# Altium footprint library Connectors.PcbLib: 69 footprints (part 1 of 5)
Each footprint in its own frame and in the unit in brackets; x right, y up, seen from the top. Pads: shape width x height; smd on the part's side, far side on the other; paste and mask are expansions set on the pad; w line width, h text height; cw(c..) or ccw(c..) is an arc to the next point about the centre after c.
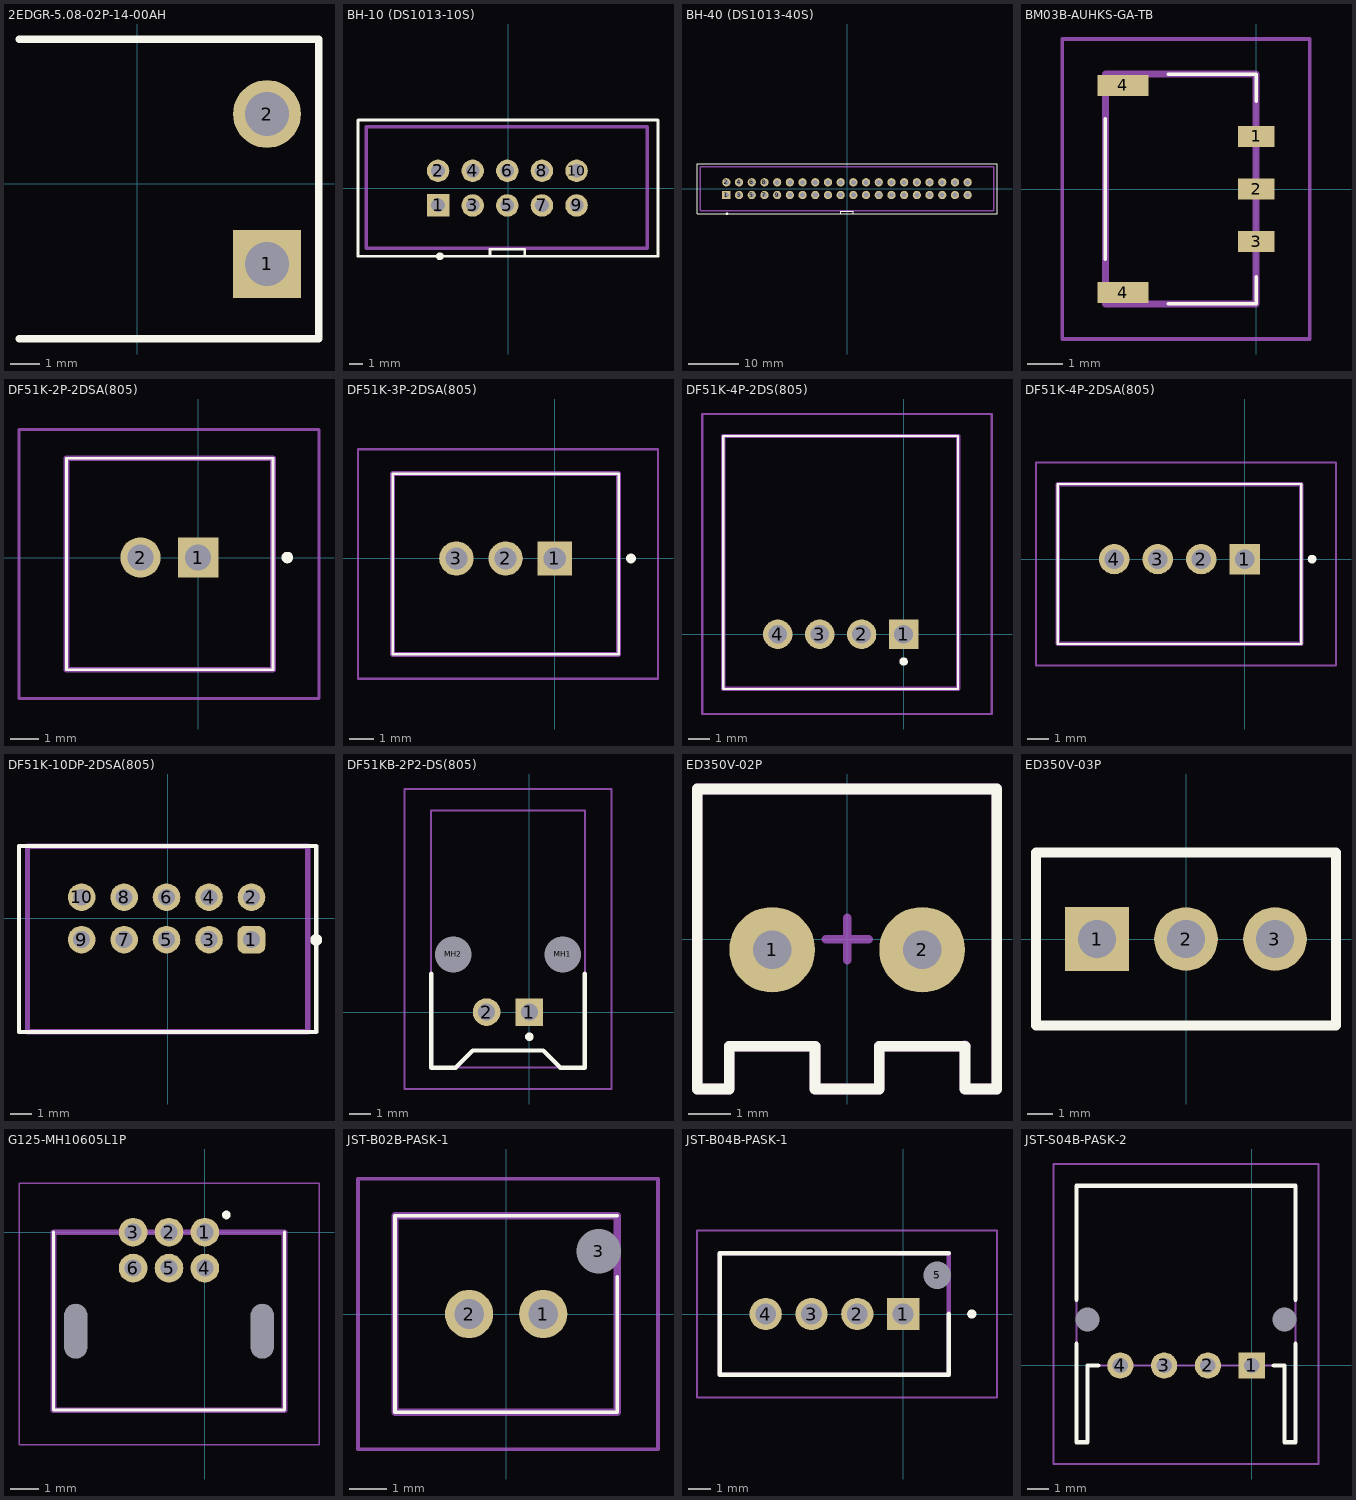
[diagram p0: the footprints below, top view; thin cyan lines are the x and y axes]

## 2EDGR-5.08-02P-14-00AH [mm]
pads (2):
  rect 2.3x2.3 hole 1.5 mask+0.05: 1(4.39,-2.72)
  round 2.3 hole 1.5 mask+0.05: 2(4.39,2.36)
Top Overlay:
  lines w0.254: -4.01,-5.26 6.15,-5.26 6.15,4.9 -4.01,4.9
3D body "2EDGR-5.08-02P-14-00AH.STEP": height 8.2, standoff -4, extent -5.95,-5.26 6.15,4.9

## BH-10 (DS1013-10S) [mm]
pads (10):
  rect 1.65x1.65 hole 1 mask+0.05: 1(-5.13,-1.27)
  round 1.65 hole 1 mask+0.05: 2(-5.13,1.27) 3(-2.59,-1.27) 4(-2.59,1.27) 5(-0.05,-1.27) 6(-0.05,1.27) 7(2.49,-1.27) 8(2.49,1.27) 9(5.03,-1.27) 10(5.03,1.27)
Top Overlay:
  circle w0.3: c-5,-5 r0.131
  lines w0.2: -1.32,-5 -1.32,-4.49 1.22,-4.49 1.22,-5 ; -11,-5 -11,5 11,5 11,-5 -11,-5
Top 3D Body (Mech13):
  lines w0.254: -10.4,-4.4 10.2,-4.4 10.2,4.5 -10.4,4.5 -10.4,-4.4
3D body "DS1013-10S (IDC-10MS CONNFLY).stp": height 9.05, standoff -3.55, extent -10.3,-4.514 10.2,4.386

## BH-40 (DS1013-40S) [mm]
pads (40):
  rect 1.65x1.65 hole 1 mask+0.05: 1(-24.13,-1.27)
  round 1.65 hole 1 mask+0.05: 2(-24.13,1.27) 3(-21.59,-1.27) 4(-21.59,1.27) 5(-19.05,-1.27) 6(-19.05,1.27) 7(-16.51,-1.27) 8(-16.51,1.27) 9(-13.97,-1.27) 10(-13.97,1.27) 11(-11.43,-1.27) 12(-11.43,1.27) 13(-8.89,-1.27) 14(-8.89,1.27) 15(-6.35,-1.27) 16(-6.35,1.27) 17(-3.81,-1.27) 18(-3.81,1.27) 19(-1.27,-1.27) 20(-1.27,1.27) 21(1.27,-1.27) 22(1.27,1.27) 23(3.81,-1.27) 24(3.81,1.27) 25(6.35,-1.27) 26(6.35,1.27) 27(8.89,-1.27) 28(8.89,1.27) 29(11.43,-1.27) 30(11.43,1.27) 31(13.97,-1.27) 32(13.97,1.27) 33(16.51,-1.27) 34(16.51,1.27) 35(19.05,-1.27) 36(19.05,1.27) 37(21.59,-1.27) 38(21.59,1.27) 39(24.13,-1.27) 40(24.13,1.27)
Top Overlay:
  circle w0.3: c-24,-5 r0.131
  lines w0.2: -1.27,-5 -1.27,-4.549 1.27,-4.549 1.27,-5 ; -30,-5 -30,5 30,5 30,-5 -30,-5
Top 3D Body (Mech13):
  lines w0.254: -29.4,-4.4 -29.4,4.374 29.4,4.374 29.4,-4.4 -29.4,-4.4
3D body "DS1013-40S (IDC-40MS CONNFLY).step": height 9.05, standoff -3.55, extent -29.3,-4.549 29.3,4.351

## BM03B-AUHKS-GA-TB [mm]
pads (5):
  rect 1.05x0.6 smd: 1(0,1.5) 2(0,0) 3(0,-1.5)
  rect 1.45x0.6 smd: 4(-3.8,-2.95) 4(-3.8,2.95)
Top Overlay:
  lines w0.1: -4.3,-2 -4.3,2 ; -2.5,-3.275 0,-3.275 0,-2.5 ; -2.5,3.275 0,3.275 0,2.5
Top 3D Body (Mech13):
  lines w0.2: -4.3,-3.275 -4.3,3.275 0,3.275 0,-3.275 -4.3,-3.275
Mechanical 15:
  lines w0.1: -5.525,-4.275 -5.525,4.275 1.525,4.275 1.525,-4.275 -5.525,-4.275
3D body "BM03B-AUHKS-GA-TB__LF__SN_.stp": height 1.95, standoff 0, extent -4.465,-3.275 0.465,3.275

## DF51K-2P-2DSA(805) [mm]
pads (2):
  rect 1.4x1.4 hole 0.9: 1(0,0)
  round 1.4 hole 0.9: 2(-2,0)
Top Overlay:
  lines w0.1: -4.572,-3.9 -4.572,3.45 2.6,3.45 2.6,-3.9 -4.572,-3.9
  lines w0.2: 3,0 cw(c3.1,0) 3.2,0 cw(c3.1,0) 3,0
Top 3D Body (Mech13):
  lines w0.2: -4.572,-3.9 -4.572,3.45 2.6,3.45 2.6,-3.9 -4.572,-3.9
Mechanical 15:
  lines w0.1: -6.223,-4.9 -6.223,4.45 4.2,4.45 4.2,-4.9 -6.223,-4.9
3D body "DF51K-2P-2DSA(805)_CL0480-0542-0-05_3DDrawing_STEP_DF51K-2P-2DSA_4800542000_3D_stp.stp": height 8.44, standoff -2.96, extent -4.618,-3.875 2.582,3.475

## DF51K-3P-2DSA(805) [mm]
pads (3):
  rect 1.4x1.4 hole 0.9: 1(0,0)
  round 1.4 hole 0.9: 2(-2,0) 3(-4,0)
Top Overlay:
  lines w0.1: -6.591,-3.9 2.6,-3.9 2.6,3.45 -6.591,3.45 -6.591,-3.9
  lines w0.2: 3,0 ccw(c3.1,0) 3.2,0 ccw(c3.1,0) 3,0
Top 3D Body (Mech13):
  lines w0.2: -6.591,-3.9 2.6,-3.9 2.6,3.45 -6.591,3.45 -6.591,-3.9
Mechanical 15:
  lines w0.1: -8,-4.9 4.2,-4.9 4.2,4.45 -8,4.45 -8,-4.9
3D body "DF51K-3P-2DSA(805)_CL0480-0543-0-05_3DDrawing_STEP_DF51K-3P-2DSA_4800543000_3D_stp.stp": height 8.41, standoff -2.99, extent -6.591,-3.925 2.609,3.425

## DF51K-4P-2DS(805) [mm]
pads (4):
  rect 1.4x1.4 hole 0.9: 1(0,0)
  round 1.4 hole 0.9: 2(-2,0) 3(-4,0) 4(-6,0)
Top Overlay:
  lines w0.1: -8.6,-2.6 2.6,-2.6 2.6,9.45 -8.6,9.45 -8.6,-2.6
  lines w0.2: -0.1,-1.3 ccw(c0,-1.3) 0.1,-1.3 ccw(c0,-1.3) -0.1,-1.3
Top 3D Body (Mech13):
  lines w0.2: -8.6,-2.6 2.6,-2.6 2.6,9.45 -8.6,9.45 -8.6,-2.6
Mechanical 15:
  lines w0.1: -9.6,-3.8 4.2,-3.8 4.2,10.5 -9.6,10.5 -9.6,-3.8
3D body "DF51K-4P-2DS(805)_CL0480-0589-0-05_3DDrawing_STEP_DF51K-4P-2DS_4800589000_3D_stp.stp": height 6.38, standoff -2.92, extent -8.6,-2.6 2.6,9.45

## DF51K-4P-2DSA(805) [mm]
pads (4):
  rect 1.4x1.4 hole 0.9: 1(0,0)
  round 1.4 hole 0.9: 2(-2,0) 3(-4,0) 4(-6,0)
Top Overlay:
  lines w0.1: -8.6,-3.9 2.6,-3.9 2.6,3.45 -8.6,3.45 -8.6,-3.9
  lines w0.2: 3,0 ccw(c3.1,0) 3.2,0 ccw(c3.1,0) 3,0
Top 3D Body (Mech13):
  lines w0.2: -8.6,-3.9 2.6,-3.9 2.6,3.45 -8.6,3.45 -8.6,-3.9
Mechanical 15:
  lines w0.1: -9.6,-4.9 4.2,-4.9 4.2,4.45 -9.6,4.45 -9.6,-4.9
3D body "DF51K-4P-2DSA(805)_CL0480-0544-0-05_3DDrawing_STEP_DF51K-4P-2DSA_4800544000_3D_stp.stp": height 8.41, standoff -2.99, extent -8.648,-3.897 2.552,3.453

## DF51K-10DP-2DSA(805) [mm]
pads (10):
  rrect50% 1.3x1.3 hole 0.8 mask+0.05: 1(3.95,-1)
  round 1.3 hole 0.8 mask+0.05: 2(3.95,1) 3(1.95,-1) 4(1.95,1) 5(-0.05,-1) 6(-0.05,1) 7(-2.05,-1) 8(-2.05,1) 9(-4.05,-1) 10(-4.05,1)
Top Overlay:
  circle w0.3: c7,-1.008 r0.131
  lines w0.2: -7,-5.342 -7,3.408 7,3.408 7,-5.342 -7,-5.342
Top 3D Body (Mech13):
  lines w0.254: -6.6,-5.342 6.6,-5.342 6.6,3.408 -6.6,3.408 -6.6,-5.342
3D body "DF51K-10DP-2DSA_4800550000_3D.stp": height 8.44, standoff -2.96, extent -6.65,-5.342 6.55,3.408

## DF51KB-2P2-DS(805) [mm]
pads (4):
  rect 1.3x1.3 hole 0.8: 1(0,0)
  round 1.3 hole 0.8: 2(-2,0)
  round 0.85 hole 1.7 unplated: MH1(1.57,2.7) MH2(-3.57,2.7)
Top Overlay:
  lines w0.2: -4.6,1.8 -4.6,-2.6 -3.45,-2.6 -2.65,-1.8 0.65,-1.8 1.45,-2.6 2.6,-2.6 2.6,1.8
  lines w0.3: 0,-1.2 cw(c0,-1.15) 0,-1.1 cw(c0,-1.15) 0,-1.2
Top 3D Body (Mech13):
  lines w0.1: -4.6,-2.6 2.6,-2.6 2.6,9.45 -4.6,9.45 -4.6,-2.6
Mechanical 15:
  lines w0.1: -5.845,-3.6 3.845,-3.6 3.845,10.45 -5.845,10.45 -5.845,-3.6
3D body "DF51KB-2P-2DS_4800587000_3D.stp": height 6.32, standoff -2.98, extent -4.6,-2.6 2.6,9.45

## ED350V-02P [mm]
pads (2):
  round 2 hole 0.9: 1(-1.75,-0.25) 2(1.75,-0.25)
Top Overlay:
  lines w0.25: 3.48,-3.498 2.75,-3.5 2.75,-2.5 0.75,-2.5 0.75,-3.5 -0.75,-3.5 -0.75,-2.5 -2.75,-2.5 -2.75,-3.5 -3.5,-3.5 -3.5,3.5 3.48,3.502 ; 3.493,-3.498 3.493,3.502
Top 3D Body (Mech13):
  lines w0.25: 2.743,-2.498 2.743,-3.498 3.493,-3.498 3.493,3.502 ; 2.75,-3.5 3.48,-3.498 ; 2.75,-2.5 0.75,-2.5 0.75,-3.5 -0.75,-3.5 -0.75,-2.5 -2.75,-2.5 -2.75,-3.5 -3.5,-3.5 -3.5,3.5 3.48,3.502
Mechanical 15:
  lines w0.2: -0.5,0 0.5,0 ; 0,-0.5 0,0.5
  lines w0.25: 2.743,-2.498 2.743,-3.498 3.493,-3.498 3.493,3.502 ; 2.75,-3.5 3.48,-3.498 ; 2.75,-2.5 0.75,-2.5 0.75,-3.5 -0.75,-3.5 -0.75,-2.5 -2.75,-2.5 -2.75,-3.5 -3.5,-3.5 -3.5,3.5 3.48,3.502
3D body "User Library-KF350-2P.STEP": height 8.8, standoff -2.6, extent -3.5,-3.4 3.5,3.5

## ED350V-03P [mm]
height 8.4
pads (3):
  rect 2.5x2.5 hole 1.5: 1(-3.5,0)
  round 2.5 hole 1.5: 2(0,0) 3(3.5,0)
Top Overlay:
  lines w0.4: -5.9,-3.4 -5.9,3.4 5.9,3.4 5.9,-3.4 -5.9,-3.4
Top 3D Body (Mech13):
  lines w0.3: -5.9,-3.4 5.9,-3.4 5.9,3.4 -5.9,3.4 -5.9,-3.4
3D body "User Library-DG350-3,5-03P.STEP": height 8.4, standoff -3.5, extent -5.75,-3.4 5.75,3.4

## G125-MH10605L1P [mm]
pads (8):
  round 1 hole 0.6 mask+0.05: 1(0,0) 2(-1.25,0) 3(-2.5,0) 4(0,-1.25) 5(-1.25,-1.25) 6(-2.5,-1.25)
  round 0 hole 0.8 slot 1.9 at 90 deg unplated: 7(2,-3.45) 8(-4.5,-3.45)
Top Overlay:
  circle w0.2: c0.75,0.6 r0.05
  lines w0.1: -5.275,0 -5.275,-6.2 2.775,-6.2 2.775,0
Top 3D Body (Mech13):
  lines w0.2: -5.275,-6.2 -5.275,0 2.775,0 2.775,-6.2 -5.275,-6.2
Mechanical 15:
  lines w0.05: -6.475,-7.4 -6.475,1.7 3.975,1.7 3.975,-7.4 -6.475,-7.4
3D body "G125-MH10605L1P.stp": height 5.5, standoff -3.24, extent -5.19,-7.99 2.69,0.2

## JST-B02B-PASK-1 [mm]
pads (3):
  round 1.3 hole 0.8: 1(1,0) 2(-1,0)
  round 0.6 hole 1.2 unplated: 3(2.5,1.7)
Top Overlay:
  lines w0.1: 3,1 3,-2.65 -3,-2.65 -3,2.65 3,2.65
Top 3D Body (Mech13):
  lines w0.2: -3,-2.65 3,-2.65 3,2.65 -3,2.65 -3,-2.65
Mechanical 15:
  lines w0.1: -4,-3.65 4.1,-3.65 4.1,3.65 -4,3.65 -4,-3.65
3D body "B02B-PASK-1__LF___SN_.stp": height 7.65, standoff -3.05, extent -3,-3.15 3,2.15

## JST-B04B-PASK-1 [mm]
pads (5):
  rect 1.41x1.41 hole 0.91: 1(0,0)
  round 1.41 hole 0.91: 2(-2,0) 3(-4,0) 4(-6,0)
  round 0.6 hole 1.2 unplated: 5(1.5,1.7)
Top Overlay:
  lines w0.2: 2,0 2,-2.65 -8,-2.65 -8,2.65 2,2.65 ; 3,-0.1 ccw(c3,0) 3,0.1 ccw(c3,0) 3,-0.1
Top 3D Body (Mech13):
  lines w0.2: -8,-2.65 -8,2.65 2,2.65 2,-2.65 -8,-2.65
Mechanical 15:
  lines w0.1: -9,-3.65 -9,3.65 4.1,3.65 4.1,-3.65 -9,-3.65
3D body "B04B-PASK-1__LF___SN_.stp": height 7.73, standoff -2.97, extent -7.99,-3.11 2.01,2.19

## JST-S04B-PASK-2 [mm]
pads (6):
  rect 1.2x1.2 hole 0.7: 1(0,0)
  round 1.2 hole 0.7: 2(-2,0) 3(-4,0) 4(-6,0)
  round 0.55 hole 1.1 unplated: MH1(1.5,2.1) MH2(-7.5,2.1)
Top Overlay:
  lines w0.2: -8,1 -8,-3.5 -7.5,-3.5 -7.5,0 -7,0 ; -8,3 -8,8.2 2,8.2 2,3 ; 1,0 1.5,0 1.5,-3.5 2,-3.5 2,1
Top 3D Body (Mech13):
  lines w0.1: -8,-3.5 -7.5,-3.5 -7.5,0 -3,0 1.5,0 1.5,-3.5 2,-3.5 2,8.2 -8,8.2 -8,-3.5
Mechanical 15:
  lines w0.1: -9.05,-4.5 -9.05,9.2 3.05,9.2 3.05,-4.5 -9.05,-4.5
3D body "S04B-PASK-2.STEP": height 6.52, standoff -3.38, extent -8,-3.5 2,8.2